# Altium footprint library BARKO_PCBLIB.PcbLib: 531 footprints (part 4 of 34)
Each footprint in its own frame and in the unit in brackets; x right, y up, seen from the top. Pads: shape width x height; smd on the part's side, far side on the other; paste and mask are expansions set on the pad; w line width, h text height; cw(c..) or ccw(c..) is an arc to the next point about the centre after c.
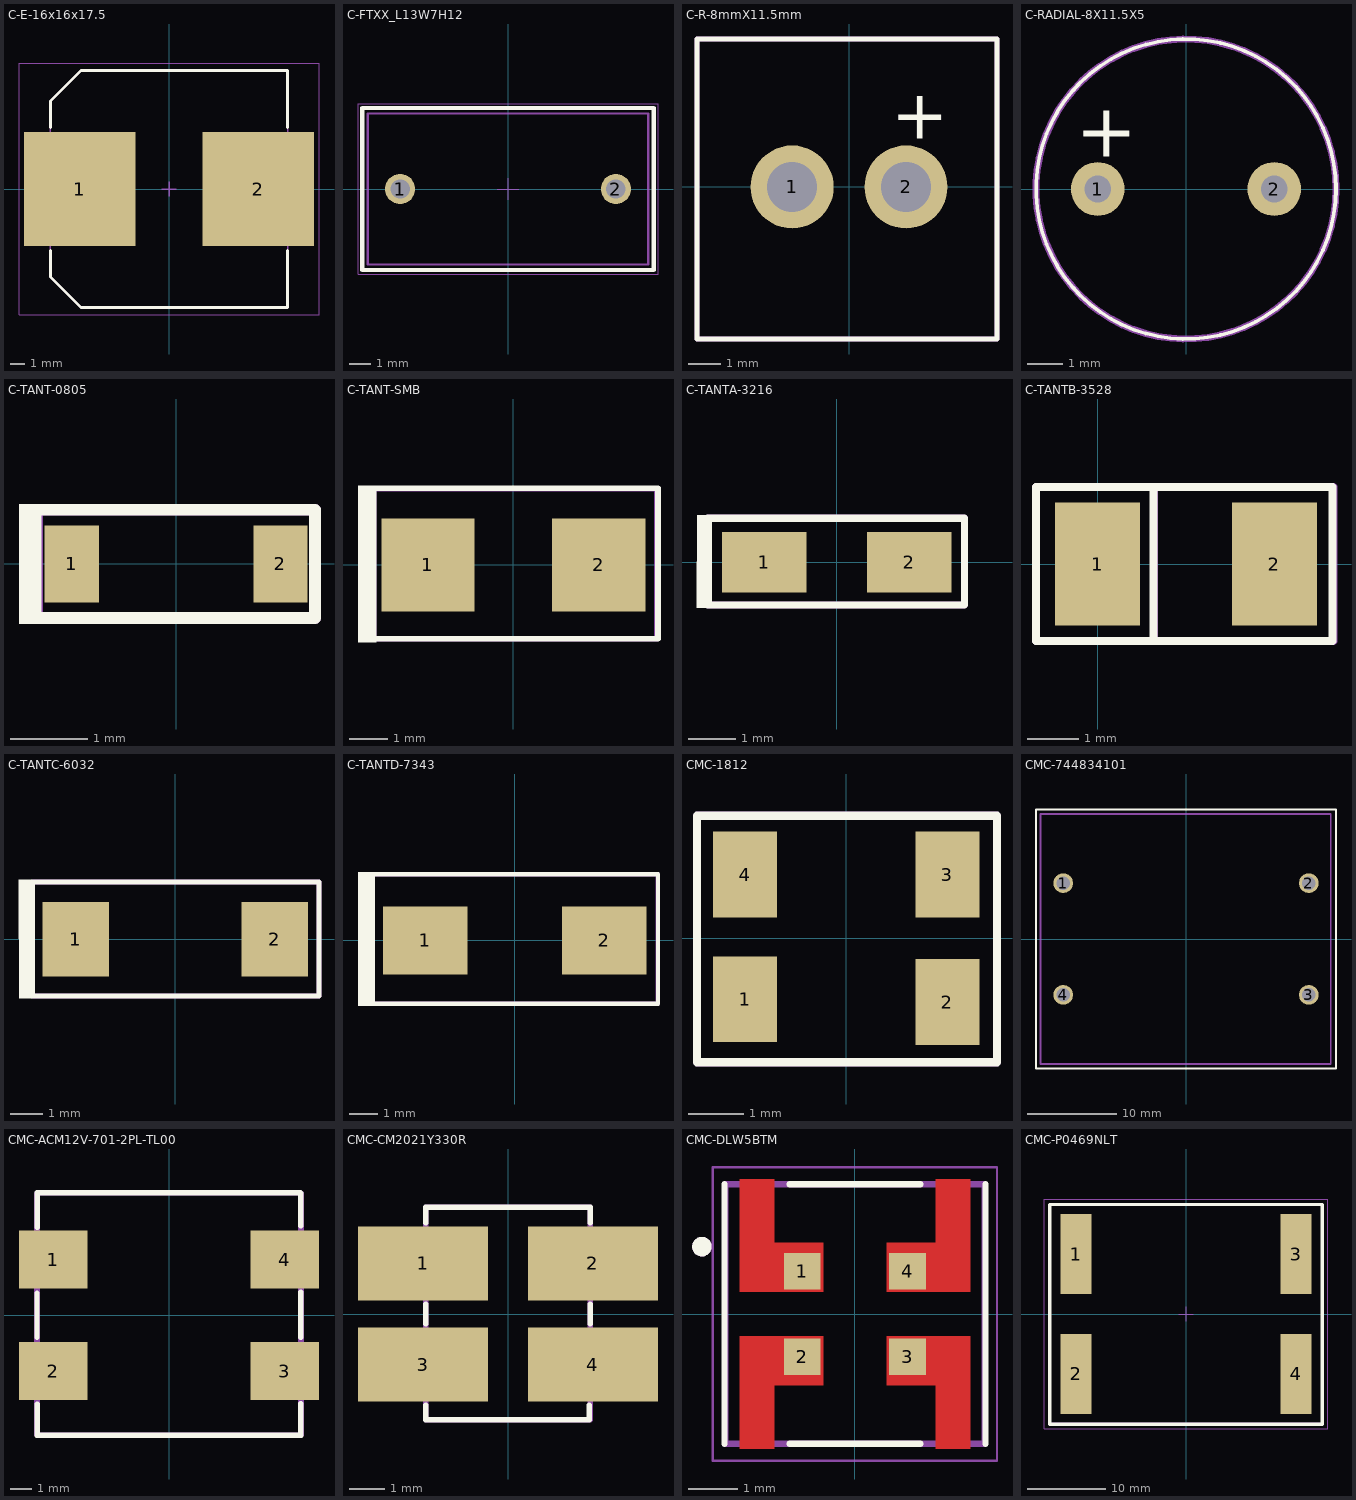
[diagram p3: the footprints below, top view; thin cyan lines are the x and y axes]

## C-E-16x16x17.5 [mm] "Aluminum Electrolytic Capacitor, Body 16.60x16.60x17.50mm, IPC Medium Density"
height 17.5
pads (2):
  rect 7.8x8 smd: 1(-6.25,0) 2(6.25,0)
Top Overlay:
  lines w0.2: -8.3,-4.3 -8.3,-6.15 -6.15,-8.3 8.3,-8.3 8.3,-4.3 ; -8.3,4.3 -8.3,6.15 -6.15,8.3 8.3,8.3 8.3,4.3
Mechanical 15:
  lines w0.05: -10.5,-8.8 -10.5,8.8 10.5,8.8 10.5,-8.8 -10.5,-8.8
  lines w0.1: -0.5,0 0.5,0 ; 0,-0.5 0,0.5
ASM Top:
  lines w0.1: -8.3,-6.15 -6.15,-8.3 8.3,-8.3 8.3,8.3 -6.15,8.3 -8.3,6.15 -8.3,-6.15
  text ".designator" at 0.103,-1.142 h0.8
3D body "C-E-16x16x17.5.step": height 17.5, standoff 0, extent -9.15,-8.3 9.15,8.3

## C-FTXX_L13W7H12 [mm] "Film Capacitors, 13x7x12mm"
height 12
pads (2):
  round 1.4 hole 0.9: 1(-5,0) 2(5,0)
Top Overlay:
  lines w0.2: -6.75,-3.75 6.75,-3.75 6.75,3.75 -6.75,3.75 -6.75,-3.75
Mechanical 15:
  lines w0.05: -0.5,0 0.5,0 ; 0,-0.5 0,0.5 ; -6.95,-3.95 6.95,-3.95 6.95,3.95 -6.95,3.95 -6.95,-3.95
ASM Top:
  lines w0.1: -6.5,-3.5 6.5,-3.5 6.5,3.5 -6.5,3.5 -6.5,-3.5
  text ".designator" at -0.5,-0.2 h1.5
3D body "10x13x12x7.stp": height 12.05, standoff -19.95, extent -6.5,-3.5 6.5,3.5

## C-R-8mmX11.5mm [mil]
pads (2):
  round 100 hole 60: 1(-68.5,0) 2(68.5,0)
Top Overlay:
  lines w6: -183,-183 178,-183 178,178 -183,178 -183,-183
  text "+" at 51,58 h60
ASM Top:
  lines w6: -183,-183 178,-183 178,178 -183,178 -183,-183
  text ".designator" at -33.14,-2.23 h31.5
3D body "CapAluRadial_D80H115.STEP": height 512.81, standoff -117.11, extent -170,-169.45 164.64,165

## C-RADIAL-8X11.5X5 [mil]
pads (2):
  round 60 hole 30: 1(-98.43,0) 2(98.43,0)
Top Overlay:
  circle w4: c0,0 r167.3
  text "+" at -123,36 h60
ASM Top:
  circle w7.87: c0,0 r167.3
  text ".designator" at -21,-1 h31.5
3D body "C-RADÝAL-8X11.5X5.step": height 630.18, standoff -393.76, extent -165.75,-165 168.89,170

## C-TANT-0805 [mm]
pads (2):
  rect 0.7x1 smd mask+0.05: 1(-1.35,0) 2(1.35,0)
Top Overlay:
  rectangle: -2.032,-0.778 -1.741,0.776
  region: -2.032,0.762
  lines w0.152: -1.865,-0.7 1.8,-0.7 1.8,0.7 -1.865,0.7
ASM Top:
  lines w0.152: -1.8,-0.7 1.8,-0.7 1.8,0.7 -1.8,0.7 -1.8,-0.7
  text ".designator" at -1.626,-0.533 h0.8
3D body "F92-P.step": height 1.26, standoff 0.01, extent -1.105,-0.673 1.105,0.673
3D body: height 0.25, standoff 0, extent -0.5,0.5 -0.5,0.5

## C-TANT-SMB [mil]
pads (2):
  rect 96x96 smd mask+1.97: 1(-88,0) 2(88,0)
Top Overlay:
  region: -141,81.5 -160,81.5 -160,-79.5 -141,-79.5
  lines w6: 149,78 149,23 149,-76 -144,-76 -144,79 149,79
ASM Top:
  lines w6: -144,-76 -144,78.5 148,78.5 148,24 148,-76 -144,-76
  text ".designator" at -27.56,-19.68 h31.5
3D body "User Library-DO-214AA(SMB).STEP": height 104.5, standoff 0.5, extent -110,-77 110,78.5

## C-TANTA-3216 [mm]
pads (2):
  rect 1.78x1.27 smd: 1(-1.525,0) 2(1.525,0)
Top Overlay:
  region: -2.641,-0.965 -2.947,-0.965 -2.947,0.991 -2.641,0.991
  region: 3.378,-1.067
  lines w0.152: -2.725,-0.9 2.696,-0.9 2.696,0.105 2.696,0.925 -2.725,0.925 -2.725,-0.9
ASM Top:
  lines w0.152: 2.696,-0.9 -2.725,-0.9 -2.725,0.925 2.696,0.925 ; 2.696,-0.894 2.696,0.057 2.696,0.584 2.696,0.931
  text ".designator" at -2.311,-0.508 h0.8
3D body "Tantalum_Case-A_EIA-3216-18.step": height 1.8, standoff 0, extent -1.7,-0.9 1.7,0.9

## C-TANTB-3528 [mm]
pads (2):
  rect 1.65x2.4 smd: 1(0,0) 2(3.45,0)
Top Overlay:
  lines w0.152: 1.089,-1.494 1.089,1.5 ; -1.2,-1.5 -1.2,1.5 4.583,1.5 4.583,-1.5 -1.2,-1.5
ASM Top:
  lines w0.152: 1.106,-1.5 1.106,1.5 ; -1.2,-1.5 1.6,-1.5 4.6,-1.5 4.6,1.5 -1.2,1.5 -1.2,-1.5
  text ".designator" at 1.6,0 h0.8
3D body "Tantalum_Case-B_EIA-3528-21.step": height 2.1, standoff 0, extent -0.25,-1.5 3.45,1.5

## C-TANTC-6032 [mm]
pads (2):
  rect 2.03x2.28 smd: 1(-3.037,0) 2(3.037,0)
Top Overlay:
  region: -4.279,-1.803 -4.763,-1.803 -4.763,1.822 -4.279,1.822
  lines w0.152: -4.35,-1.725 -4.35,1.75 4.394,1.75 4.394,-1.725 -4.35,-1.725
ASM Top:
  lines w0.152: -4.35,-1.725 4.394,-1.725 4.394,0.101 4.394,1.75 -4.35,1.75 -4.35,-1.725
  text ".designator" at -1.2,-0.2 h0.8
3D body "Tantalum_Case-C_EIA-6032-28.step": height 2.8, standoff 0, extent -3.15,-1.753 3.15,1.747

## C-TANTD-7343 [mm]
pads (2):
  rect 3x2.41 smd: 1(-3.185,0) 2(3.185,0)
Top Overlay:
  region: -4.978,-2.325 -5.573,-2.325 -5.573,2.426 -4.978,2.426
  lines w0.152: 5.093,-2.25 -5.156,-2.25 -5.156,2.35 5.093,2.35 5.093,1.157 5.093,-0.443 5.093,-1.587 5.093,-2.225
ASM Top:
  lines w0.152: 5.081,-2.25 5.081,-0.976 5.081,2.35 ; 5.093,-2.25 -5.156,-2.25 -5.156,2.35 5.093,2.35
  text ".designator" at -0.8,-0.3 h0.8
3D body "Tantalum_Case-D_EIA-7343-31.step": height 3.1, standoff 0, extent -3.8,-2.3 3.8,2.3

## CMC-1812 [mm]
pads (4):
  rect 1.15x1.55 smd: 1(-1.825,-1.1) 2(1.825,-1.15) 3(1.825,1.15) 4(-1.825,1.15)
Top Overlay:
  lines w0.15: -2.692,-2.235 -2.692,2.21 2.718,2.21 2.718,-2.235 -2.692,-2.235
ASM Top:
  lines w0.15: -2.692,-2.235 2.718,-2.235 2.718,2.21 -2.692,2.21 -2.692,-2.235
  text ".designator" at -0.3,-0.1 h0.8
3D body "STEP-WE-CNSW-1812-rev1.stp": height 2.81, standoff -0.04, extent -2.25,-1.6 2.25,1.6

## CMC-744834101 [mm]
pads (4):
  round 2.2 hole 1.5: 1(-13.75,6.25) 2(13.75,6.25) 3(13.75,-6.25) 4(-13.75,-6.25)
Top Overlay:
  lines w0.254: -16.8,-14.5 -16.8,14.5 16.8,14.5 16.8,-14.5 -16.8,-14.5
ASM Top:
  lines w0.2: -16.3,-14 -16.3,14 16.2,14 16.2,-14 -16.3,-14
  text ".designator" at 0.5,0.6 h0.8
3D body "L-744834101 (rev1).stp": height 20.01, standoff -2.99, extent -16.25,-14 16.25,14

## CMC-ACM12V-701-2PL-TL00 [mm] "CMC 8A 2LN 700 OHM SMD AEC-Q200"
height 6
pads (4):
  rect 3.2x2.7 smd: 1(-5.4,2.6) 2(-5.4,-2.6) 3(5.4,-2.6) 4(5.4,2.6)
Top Overlay:
  lines w0.254: -6.16,-1.029 -6.16,1.033 ; -6.158,4.103 -6.158,5.729 -6.139,5.71 6.132,5.71 6.142,5.7 6.142,4.174 ; -6.151,-4.157 -6.151,-5.606 ; 6.149,-4.132 6.149,-5.6 6.143,-5.606 -6.151,-5.606 ; 6.152,-1.035 6.152,1.086 ; -6.151,-5.606 -6.151,-5.606
Top 3D Body:
  lines w0.254: -6.15,-5.608 -6.15,5.71 6.15,5.692 6.15,-5.608 -6.15,-5.608
ASM Top:
  lines w0.2: -6.2,-5.6 6.2,-5.6 6.2,5.7 -6.2,5.7 -6.2,-5.6
  text ".designator" at -1.8,-0.2 h0.8
3D body "acm12v.step": height 5.41, standoff -0.14, extent -6.002,-5.456 5.998,5.544

## CMC-CM2021Y330R [mil]
pads (4):
  rect 144x82 smd mask+0: 1(-94,56) 2(94,56) 3(-94,-56) 4(94,-56)
Top Overlay:
  lines w6: -91,-101 -91,-117 90,-117 90,-101 ; -91,-11 -91,11 ; -91,101 -91,118 91,118 91,101 ; 91,-11 91,11
ASM Top:
  lines w6: -91,-117 91,-117 91,-116 91,118 -91,118 -91,-117
  text ".designator" at -31.5,-3.94 h31.5
3D body "CM2021Y330R-10.STEP": height 150.11, standoff 0.5, extent -165.49,-112 166,112.41

## CMC-DLW5BTM [mm]
height 2.8
pads (4):
  rect 0.75x0.75 smd: 1(-1.075,0.875) 2(-1.075,-0.875) 3(1.075,-0.875) 4(1.075,0.875)
Top Layer:
  region: -0.65,-0.45 -0.65,-1.45 -1.65,-1.45 -1.65,-2.75 -2.35,-2.75 -2.35,-0.45
  region: 1.65,1.45 1.65,2.75 2.35,2.75 2.35,0.45 0.65,0.45 0.65,1.45
  region: -1.65,2.75 -1.65,1.45 -0.65,1.45 -0.65,0.45 -2.35,0.45 -2.35,2.75
  region: 2.35,-0.45 2.35,-2.75 1.65,-2.75 1.65,-1.45 0.65,-1.45 0.65,-0.45
Top Overlay:
  circle w0.2: c-3.125,1.375 r0.1
  lines w0.127: -2.663,-2.65 -2.663,2.65 ; -1.336,-2.65 1.336,-2.65 ; -1.336,2.65 1.336,2.65 ; 2.663,-2.65 2.663,2.65
Mechanical 15:
  lines w0.05: -2.9,-3 -2.9,3 2.9,3 2.9,-3 -2.9,-3
ASM Top:
  circle w0.2: c-3.125,1.375 r0.1
  lines w0.127: -2.65,-2.65 2.65,-2.65 2.65,2.65 -2.65,2.65 -2.65,-2.65
  text ".designator" at -1.3,-0.3 h0.8
3D body "DLW5BTM102TQ2K--3DModel-STEP-1.STEP": height 2.51, standoff 0.01, extent -2.5,-2.5 2.5,2.5

## CMC-P0469NLT [mm]
pads (4):
  rect 3.94x10.16 smd: 1(-13.97,7.62) 2(-13.97,-7.62) 3(13.97,7.62) 4(13.97,-7.62)
Top Overlay:
  lines w0.4: -17.3,-14 17.3,-14 17.3,13.9 -17.3,13.9 -17.3,-14
Mechanical 15:
  lines w0.15: -0.9,0 0,0 ; 0,-0.9 0,0 ; 0,0.9 0,0 ; 0.9,0 0,0 ; -18,-14.6 -18,14.6 18,14.6 18,-14.6 -18,-14.6
ASM Top:
  lines w0.2: -17.3,-13.9 17.3,-13.9 17.3,13.9 -17.3,13.9 -17.3,-13.9
  text ".designator" at 0.1,-0.2 h0.8
3D body: height 11.7, standoff 1, extent -17,-13.6 17,13.6